# Altium footprint library Custom1.PcbLib: 554 footprints (part 28 of 35)
Each footprint in its own frame and in the unit in brackets; x right, y up, seen from the top. Pads: shape width x height; smd on the part's side, far side on the other; paste and mask are expansions set on the pad; w line width, h text height; cw(c..) or ccw(c..) is an arc to the next point about the centre after c.
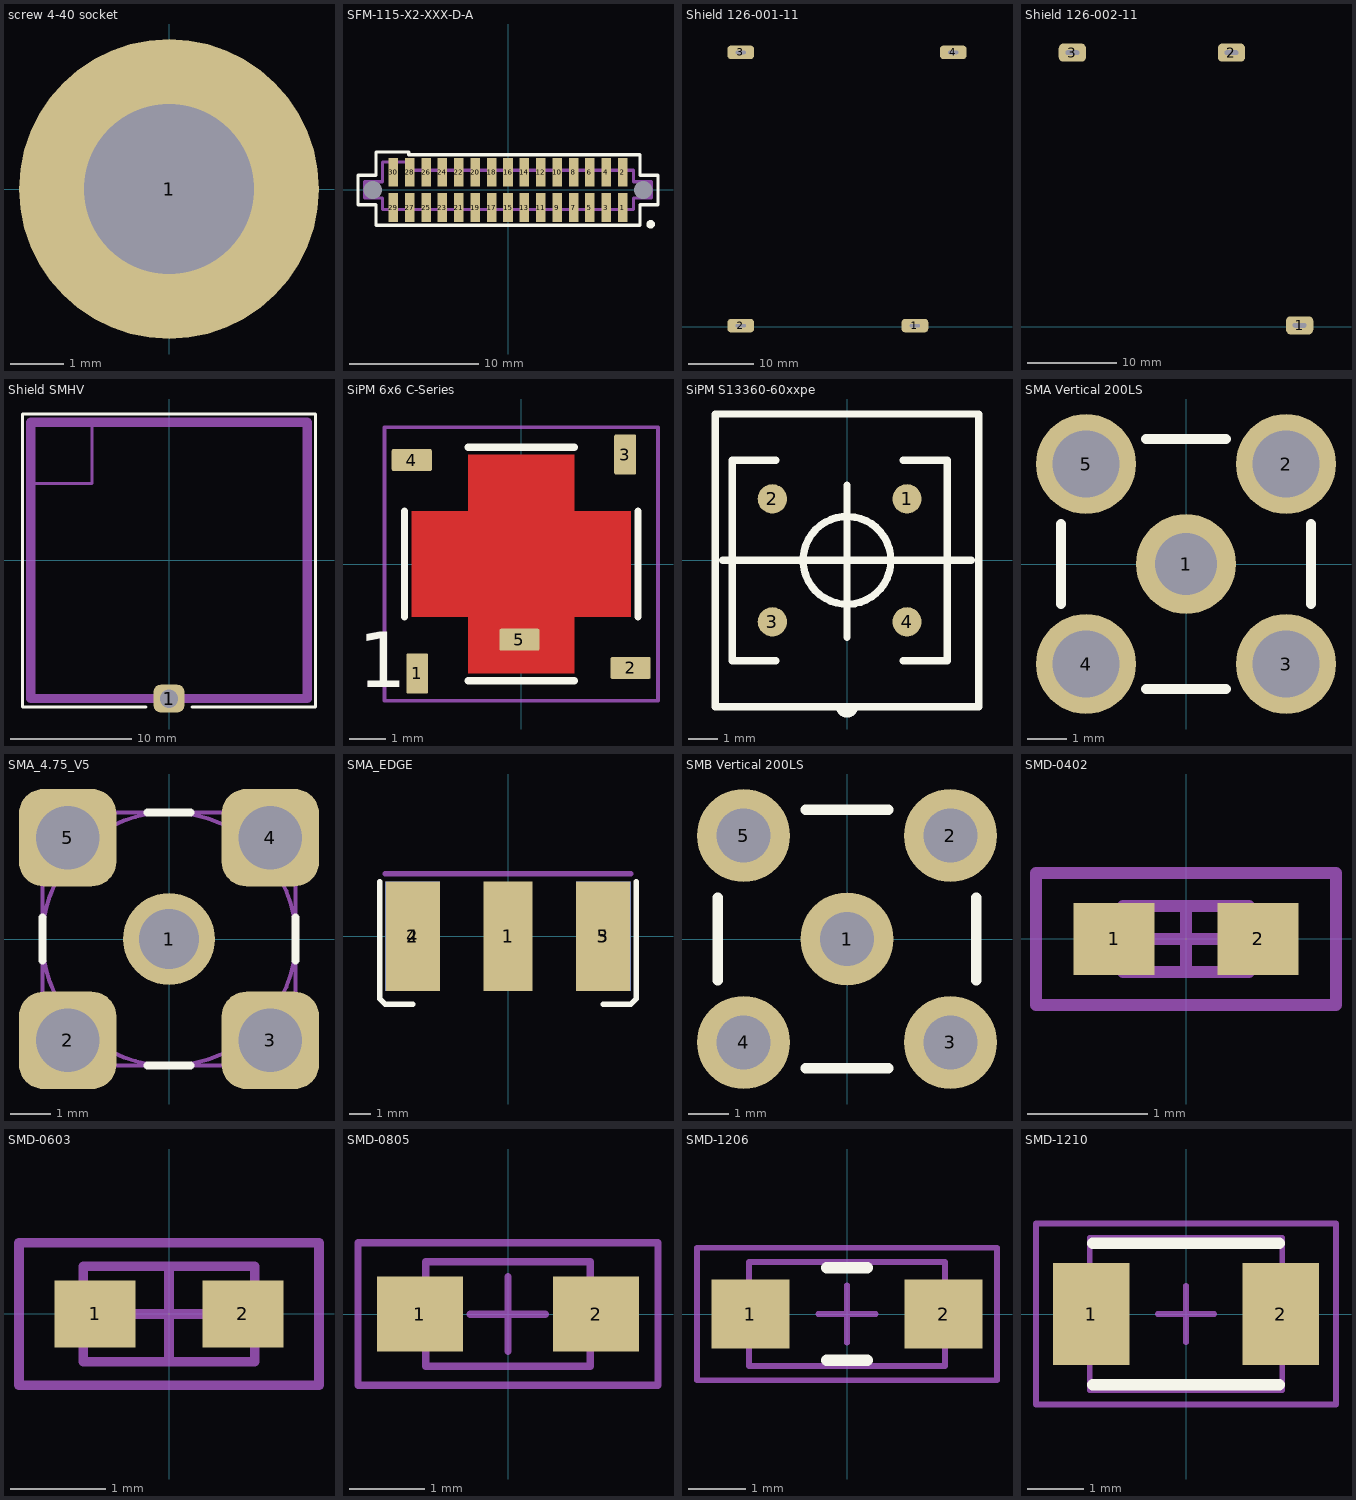
[diagram p27: the footprints below, top view; thin cyan lines are the x and y axes]

## screw 4-40 socket [mil] "0.080\" diameter pin 0.125\" flange"
pads (1):
  round 220 hole 125 paste-125: 1(0,0)

## SFM-115-X2-XXX-D-A [mil]
pads (32):
  rect 29x87.5 smd mask+2: 1(350,-53.75) 2(350,53.75) 3(300,-53.75) 4(300,53.75) 5(250,-53.75) 6(250,53.75) 7(200,-53.75) 8(200,53.75) 9(150,-53.75) 10(150,53.75) 11(100,-53.75) 12(100,53.75) 13(50,-53.75) 14(50,53.75) 15(0,-53.75) 16(0,54.13) 17(-50,-53.75) 18(-50,53.75) 19(-100,-53.75) 20(-100,53.75) 21(-150,-53.75) 22(-150,53.75) 23(-200,-53.75) 24(-200,53.75) 25(-250,-53.75) 26(-250,53.75) 27(-300,-53.75) 28(-300,53.75) 29(-350,-53.75) 30(-350,53.75)
  round 0 hole 55 unplated: MH1(412.5,0) MH2(-412.5,0)
Top Overlay:
  circle w15.75: c435,-105 r5
  lines w10: -457.5,-45 -457.5,45 -402.5,45 -402.5,115.5 -302.5,115.5 -302.5,107.5 402.5,107.5 402.5,45 457.5,45 457.5,-45 402.5,-45 402.5,-107.5 -402.5,-107.5 -402.5,-45 -457.5,-45
Mechanical 1:
  lines w10: -437.5,-25 -437.5,25 -382.5,25 -382.5,85 -302.5,85 -302.5,60 382.5,60 382.5,25 437.5,25 437.5,-25 382.5,-25 382.5,-60 -382.5,-60 -382.5,-25 -437.5,-25
  text "J1" at -11.81,-161.42 h30
3D body "SFM-115-02-S-D-A-K-TR.stp": height 190.5, standoff -19.5, extent -438,-80.75 437,84.75

## Shield 126-001-11 [mil]
height 225
pads (4):
  rrect50% 160x80 hole 20 slot 60 at 0 deg: 1(-761,5.99) 2(-1806.01,5.99) 3(-1806.01,1645.99) 4(-531,1645.99)
3D body "126-001-11 REVA.STEP": height 225, standoff -85, extent -2162,0 0,1652

## Shield 126-002-11 [mil]
height 403
pads (3):
  rrect50% 120x80 hole 20 slot 60 at 0 deg: 1(1505.99,6) 2(1205.99,1206) 3(505.99,1206)
3D body "126-002-11 REVA.STEP": height 435.6, standoff -84.4, extent 0,0 2112,1212

## Shield SMHV [mil]
height 0.62
pads (1):
  rrect50% 100x90 hole 60: 1(0,-448)
Top Overlay:
  lines w10: -75,-475 -475,-475 -475,475 475,475 475,-475 75,-475
Mechanical 15:
  lines w10: -448,250 -250,250 -250,448
  lines w30: -448,-448 448,-448 448,448 -448,448 -448,-448
3D body "Shield SMHV.STEP": height 627.5, standoff -199.08, extent -461.5,-461.5 461.5,461.5

## SiPM 6x6 C-Series [mm]
height 0.65
pads (5):
  rrect15% 0.6x1.1 smd: 1(-2.85,-3) 3(2.85,3)
  rrect15% 1.1x0.6 smd: 2(3,-2.85) 4(-3,2.85)
  rrect15% 1.1x0.6 smd paste-60: 5(-0.05,-2.075)
Top Layer:
  region: -3,-1.45 -3,1.45 -1.45,1.45 -1.45,3 1.45,3 1.45,1.45 3,1.45 3,-1.45 1.45,-1.45 1.45,-3 -1.45,-3 -1.45,-1.45
Top Overlay:
  lines w0.2: -3.2,-1.45 -3.2,1.45 ; -1.45,-3.2 1.45,-3.2 ; -1.45,3.2 1.45,3.2 ; 3.2,-1.45 3.2,1.45
  text "1" at -4.475,-3.375 h1.52
Top Paste:
  circle w0.8: c0,0 r0.2
Mechanical 15:
  lines w0.1: -0.25,0 0.25,0 ; 0,-0.25 0,0.25 ; -3.75,-3.75 -3.75,3.75 3.75,3.75 3.75,-3.75 -3.75,-3.75
3D body "SiPM 6x6 package.STEP": height 0.68, standoff 0.01, extent -3.556,-3.5 3.444,3.5

## SiPM S13360-60xxpe [mm] "Hamamatsu 6x6mm SMT"
pads (4):
  round 1 smd: 1(2.05,2.1) 2(-2.55,2.1) 3(-2.55,-2.1) 4(2.05,-2.1)
Top Overlay:
  circle w0.254: c0,0 r1.5
  lines w0.254: -4.25,0 4.25,0 ; -3.925,-1.925 -3.925,-3.425 ; -3.925,1.925 -3.925,3.425 ; -2.425,-3.425 -3.925,-3.425 ; -2.425,3.425 -3.925,3.425 ; -0.25,-5 ccw(c0,-5) 0.25,-5 ; 0,-2.625 0,2.575 ; 1.925,-3.425 3.425,-3.425 ; 1.925,3.425 3.425,3.425 ; 3.425,-1.925 3.425,-3.425 ; 3.425,1.925 3.425,3.425 ; -3.925,-3.425 -3.925,3.425 ; 3.425,-3.425 3.425,3.425 ; -4.5,-5 4.5,-5 4.5,5 -4.5,5 -4.5,-5
3D body "SiPM S13360-60xxPE.STEP": height 1.45, standoff -0.01, extent -3.95,-3.45 3.4,3.4

## SMA Vertical 200LS [mil]
pads (5):
  round 100 hole 62: 1(0,0)
  round 100 hole 67: 2(100,100) 3(100,-100) 4(-100,-100) 5(-100,100)
Top Overlay:
  lines w10: -125,-40 -125,40 ; -40,-125 40,-125 ; -40,125 40,125 ; 125,-40 125,40
3D body "Molex - 73391-0060(1).STEP": height 335.13, standoff -158.97, extent -119.68,-119.68 119.69,119.69

## SMA_4.75_V5 [mm] "Connector; RF Coaxial, SMA, SM; 5 Position; Vertical"
height 10.3
pads (5):
  round 2.3 / inner round 2 / far side round 2.3 hole 1.5: 1(0,0)
  rrect50% 2.44x2.44 hole 1.6: 2(-2.54,-2.54) 3(2.54,-2.54) 4(2.54,2.54) 5(-2.54,2.54)
Top Overlay:
  lines w0.2: -3.175,-0.54 -3.175,0.54 ; -0.54,-3.175 0.54,-3.175 ; -0.54,3.175 0.54,3.175 ; 3.175,-0.54 3.175,0.54
Mechanical 13:
  circle w0.1: c0,0 r3.175
  lines w0.1: -3.175,-3.175 -3.175,3.175 3.175,3.175 3.175,-3.175 -3.175,-3.175
3D body: height 2.64, standoff 0, extent -3.174,-3.174 3.174,3.174
3D body: height 10.3, standoff 2.64, extent -3.174,-3.174 3.174,3.174

## SMA_EDGE [mil]
pads (5):
  rect 90x200 smd: 1(0,0)
  rect 100x200 smd: 2(-175,0) 3(175,0)
  rect 100x200 smd far side: 4(-175,0) 5(175,0)
Top Overlay:
  lines w10: -235,100 -235,-115 -225,-125 -175,-125 ; 175,-125 225,-125 235,-115 235,100
Mechanical 13:
  lines w10: -225,115 225,115
3D body "SMA_PCB_EDGE_142-0701-851.STEP": height 161.13, standoff -150.68, extent -187.4,-72.01 187.4,472.48

## SMB Vertical 200LS [mil]
pads (5):
  round 90 hole 52: 1(0,0) 2(100,100) 3(100,-100) 4(-100,-100) 5(-100,100)
Top Overlay:
  lines w10: -125,-40 -125,40 ; -40,-125 40,-125 ; -40,125 40,125 ; 125,-40 125,40

## SMD-0402 [mm] "Chip Inductor, 2-Leads, Body 1.0x0.5x0.6 mm"
height 0.6
pads (2):
  rect 0.675x0.6 smd: 1(-0.6,0) 2(0.6,0)
Mechanical 13:
  lines w0.1: -0.525,-0.275 0.525,-0.275 0.525,0.275 -0.525,0.275 -0.525,-0.275
Mechanical 15:
  lines w0.1: -0.275,0 0.275,0 ; 0,-0.275 0,0.275 ; -1.25,-0.55 1.25,-0.55 1.25,0.55 -1.25,0.55 -1.25,-0.55
3D body "74279273.stp": height 0.49, standoff -0.01, extent -0.5,-0.25 0.5,0.25

## SMD-0603 [mm] "Chip Inductor, 2-Leads, Body 1.6x0.8x0.95 mm"
height 0.95
pads (2):
  rect 0.85x0.7 smd: 1(-0.775,0) 2(0.775,0)
Mechanical 13:
  lines w0.1: -0.9,-0.5 0.9,-0.5 0.9,0.5 -0.9,0.5 -0.9,-0.5
Mechanical 15:
  lines w0.1: -0.5,0 0.5,0 ; 0,-0.5 0,0.5 ; -1.575,-0.75 1.575,-0.75 1.575,0.75 -1.575,0.75 -1.575,-0.75
3D body "742792623.stp": height 0.79, standoff -0.01, extent -0.8,-0.4 0.8,0.401

## SMD-0805 [mm] "Chip Inductor, 2-Leads, Body 2.0x1.2x1.1 mm"
height 1.1
pads (2):
  rect 1.15x1 smd: 1(-1.175,0) 2(1.175,0)
Mechanical 13:
  lines w0.1: -1.1,-0.7 -1.1,0.7 1.1,0.7 1.1,-0.7 -1.1,-0.7
Mechanical 15:
  lines w0.1: -0.5,0 0.5,0 ; 0,-0.5 0,0.5 ; -2,-0.95 -2,0.95 2,0.95 2,-0.95 -2,-0.95
3D body "74279201.stp": height 0.89, standoff -0.01, extent -1,-0.6 1,0.6

## SMD-1206 [mm] "Chip Inductor, 2-Leads, Body 3.2x1.6x1.3 mm"
height 1.3
pads (2):
  rect 1.35x1.2 smd: 1(-1.675,0) 2(1.675,0)
Top Overlay:
  lines w0.2: -0.35,-0.8 0.35,-0.8 ; -0.35,0.8 0.35,0.8
Mechanical 13:
  lines w0.1: -1.7,-0.9 -1.7,0.9 1.7,0.9 1.7,-0.9 -1.7,-0.9
Mechanical 15:
  lines w0.1: -0.5,0 0.5,0 ; 0,-0.5 0,0.5 ; -2.6,-1.15 -2.6,1.15 2.6,1.15 2.6,-1.15 -2.6,-1.15
3D body "74279210.stp": height 1.09, standoff -0.01, extent -1.6,-0.8 1.6,0.8

## SMD-1210 [mm] "Chip Inductor, 2-Leads, Body 3.2x2.5x1.5 mm"
height 1.5
pads (2):
  rect 1.35x1.8 smd: 1(-1.675,0) 2(1.675,0)
Top Overlay:
  lines w0.2: -1.65,-1.25 1.65,-1.25 ; -1.65,1.25 1.65,1.25
Mechanical 13:
  lines w0.1: -1.7,-1.35 -1.7,1.35 1.7,1.35 1.7,-1.35 -1.7,-1.35
Mechanical 15:
  lines w0.1: -0.5,0 0.5,0 ; 0,-0.5 0,0.5 ; -2.65,-1.6 -2.65,1.6 2.65,1.6 2.65,-1.6 -2.65,-1.6
3D body "7427923.stp": height 1.29, standoff -0.01, extent -1.6,-1.25 1.6,1.25